# Altium footprint library 14-Inductors.PcbLib: 164 footprints (part 3 of 11)
Each footprint in its own frame and in the unit in brackets; x right, y up, seen from the top. Pads: shape width x height; smd on the part's side, far side on the other; paste and mask are expansions set on the pad; w line width, h text height; cw(c..) or ccw(c..) is an arc to the next point about the centre after c.
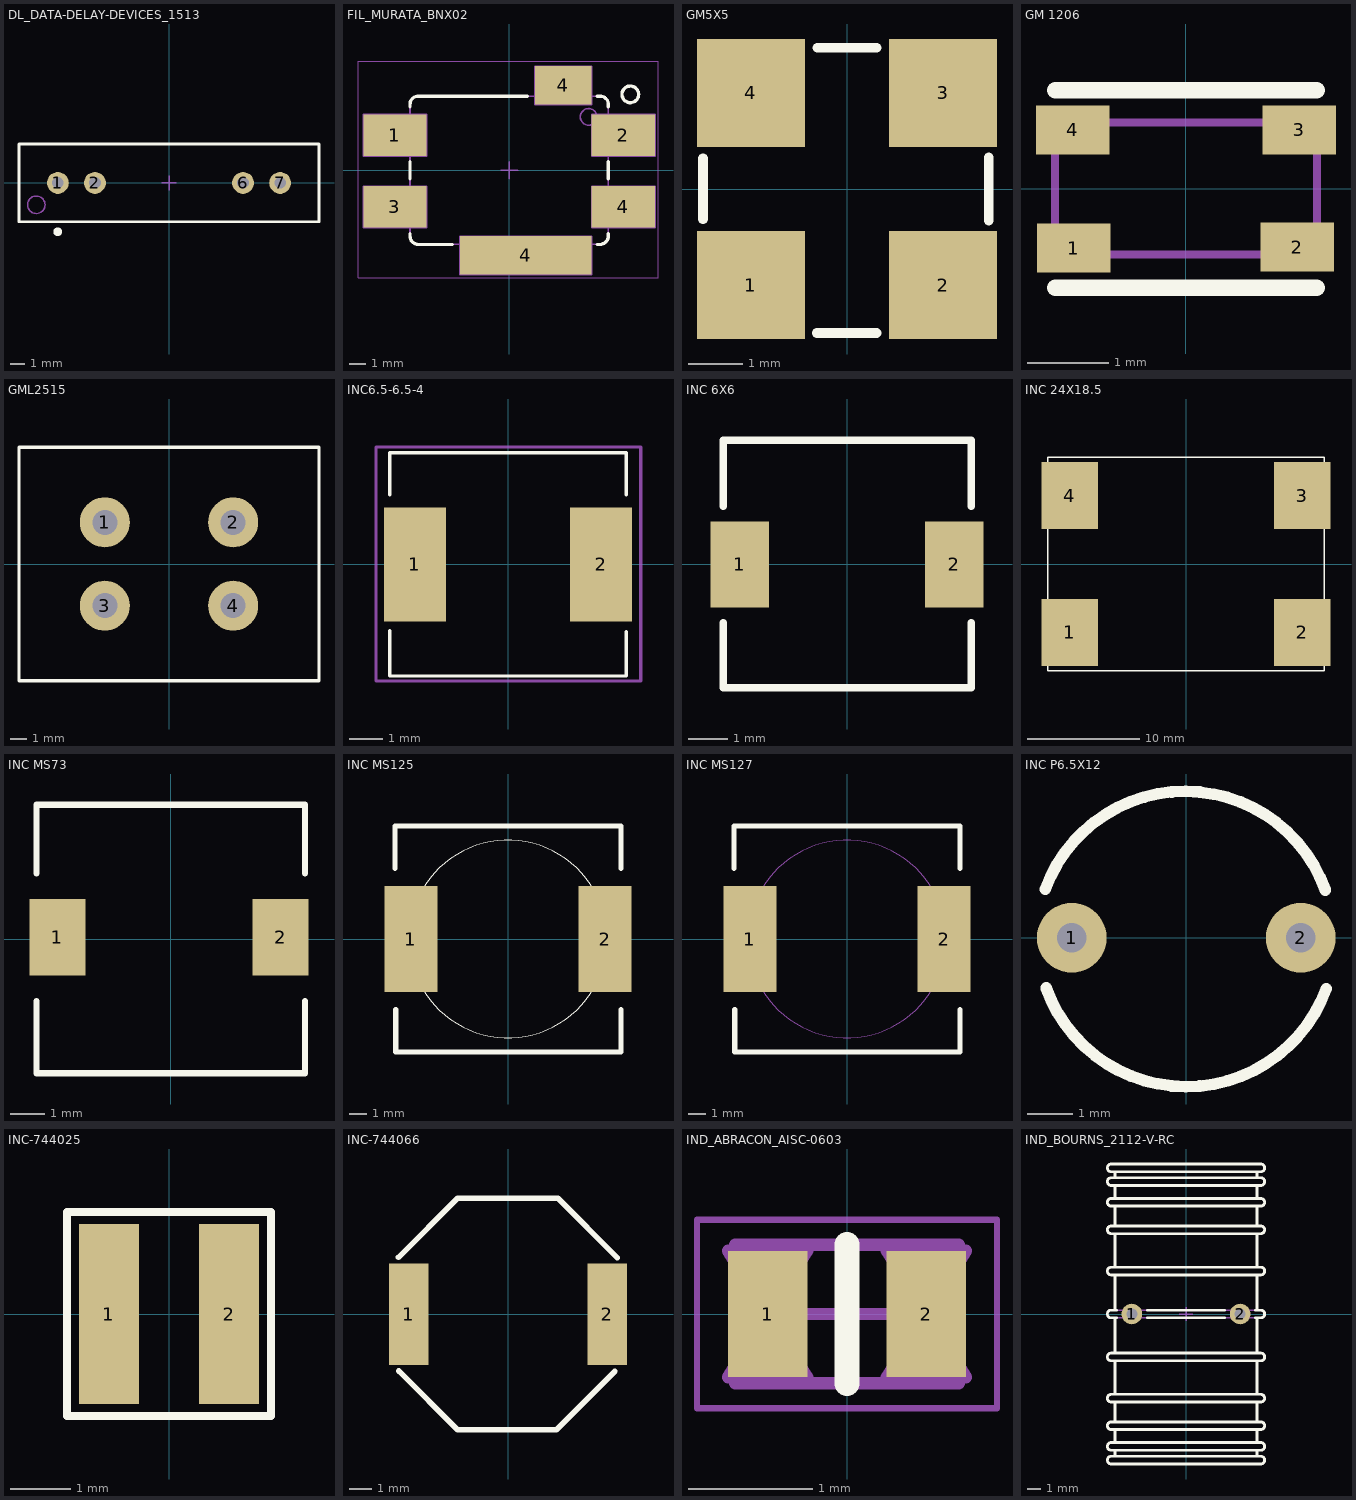
[diagram p2: the footprints below, top view; thin cyan lines are the x and y axes]

## DL_DATA-DELAY-DEVICES_1513 [mm] "Fixed SIP Delay Line Serie 1513"
height 7.11
pads (4):
  round 1.5 hole 0.8: 1(-7.62,0) 2(-5.08,0) 6(5.08,0) 7(7.62,0)
Top Overlay:
  circle w0.3: c-7.63,-3.35 r0.15
  lines w0.2: -10.287,-2.665 -10.287,2.665 10.287,2.665 10.287,-2.665 -10.287,-2.665
Mechanical 8:
  lines w0.1: -8.12,0 -7.62,0 ; -7.62,-0.5 -7.62,0 ; -7.62,0.5 -7.62,0 ; -7.12,0 -7.62,0 ; -5.58,0 -5.08,0 ; -5.08,-0.5 -5.08,0 ; -5.08,0.5 -5.08,0 ; -4.58,0 -5.08,0 ; -0.5,0 0,0 ; 0,-0.5 0,0 ; 0,0.5 0,0 ; 0.5,0 0,0 ; 4.58,0 5.08,0 ; 5.08,-0.5 5.08,0 ; 5.08,0.5 5.08,0 ; 5.58,0 5.08,0 ; 7.12,0 7.62,0 ; 7.62,-0.5 7.62,0 ; 7.62,0.5 7.62,0 ; 8.12,0 7.62,0
Mechanical 14:
  circle w0.1: c-9.1,-1.5 r0.6
  lines w0.1: -10.287,-2.665 10.287,-2.665 10.287,2.665 -10.287,2.665 -10.287,-2.665
3D body "DATA-DELAY-DEVICES_1513.stp": height 7.11, standoff -3.8, extent -10.287,-2.665 10.287,2.665

## FIL_MURATA_BNX02 [mm] "Block Type EMIFILr LC Combined Type, BNX02* Series"
height 3.3
pads (6):
  rect 3.8x2.5 smd: 1(-6.85,2.1) 2(6.85,2.1) 3(-6.85,-2.2) 4(6.85,-2.2)
  rect 7.9x2.3 smd: 4(1,-5.1)
  rect 3.4x2.3 smd: 4(3.25,5.1)
Top Overlay:
  circle w0.2: c7.268,4.554 r0.5
  lines w0.2: -5.95,-3.8 -5.95,-3.95 ccw(c-5.45,-3.95) -5.45,-4.45 -3.42,-4.45 ; -5.95,-0.5 -5.95,0.5 ; -5.95,3.8 -5.95,3.95 cw(c-5.45,3.95) -5.45,4.45 1.08,4.45 ; 5.28,-4.45 5.45,-4.45 ccw(c5.45,-3.95) 5.95,-3.95 5.95,-3.8 ; 5.28,4.45 5.45,4.45 cw(c5.45,3.95) 5.95,3.95 5.95,3.8 ; 5.95,-0.5 5.95,0.5
Mechanical 8:
  lines w0.1: -7.35,-2.2 -6.85,-2.2 ; -7.35,2.1 -6.85,2.1 ; -6.85,-2.7 -6.85,-2.2 ; -6.85,-1.7 -6.85,-2.2 ; -6.85,1.6 -6.85,2.1 ; -6.85,2.6 -6.85,2.1 ; -6.35,-2.2 -6.85,-2.2 ; -6.35,2.1 -6.85,2.1 ; -0.5,0 0,0 ; 0,-0.5 0,0 ; 0,0.5 0,0 ; 0.5,-5.1 1,-5.1 ; 0.5,0 0,0 ; 1,-5.6 1,-5.1 ; 1,-4.6 1,-5.1 ; 1.5,-5.1 1,-5.1 ; 2.75,5.1 3.25,5.1 ; 3.25,4.6 3.25,5.1 ; 3.25,5.6 3.25,5.1 ; 3.75,5.1 3.25,5.1 ; 6.35,-2.2 6.85,-2.2 ; 6.35,2.1 6.85,2.1 ; 6.85,-2.7 6.85,-2.2 ; 6.85,-1.7 6.85,-2.2 ; 6.85,1.6 6.85,2.1 ; 6.85,2.6 6.85,2.1 ; 7.35,-2.2 6.85,-2.2 ; 7.35,2.1 6.85,2.1 ; -8.75,-3.45 -4.95,-3.45 -4.95,-0.95 -8.75,-0.95 -8.75,-3.45 ; -8.75,0.85 -8.75,3.35 -4.95,3.35 -4.95,0.85 -8.75,0.85 ; -2.95,-6.25 4.95,-6.25 4.95,-3.95 -2.95,-3.95 -2.95,-6.25 ; 1.55,3.95 1.55,6.25 4.95,6.25 4.95,3.95 1.55,3.95 ; 4.95,-3.45 4.95,-0.95 8.75,-0.95 8.75,-3.45 4.95,-3.45 ; 4.95,0.85 8.75,0.85 8.75,3.35 4.95,3.35 4.95,0.85
Mechanical 14:
  circle w0.1: c4.768,3.204 r0.5
  lines w0.1: -5.95,-2.75 -6.05,-2.75 -6.05,-1.45 -5.95,-1.45 ; -5.95,1.45 -6.05,1.45 -6.05,2.75 -5.95,2.75 ; -2.5,-4.45 -2.5,-4.55 4.5,-4.55 4.5,-4.45 ; 2,4.45 2,4.55 4.5,4.55 4.5,4.45 ; 5.95,-2.75 6.05,-2.75 6.05,-1.45 5.95,-1.45 ; 5.95,1.45 6.05,1.45 6.05,2.75 5.95,2.75 ; -5.95,-3.95 ccw(c-5.45,-3.95) -5.45,-4.45 5.45,-4.45 ccw(c5.45,-3.95) 5.95,-3.95 5.95,3.95 ccw(c5.45,3.95) 5.45,4.45 -5.45,4.45 ccw(c-5.45,3.95) -5.95,3.95 -5.95,-3.95
Mechanical 15:
  lines w0.05: -9.07,-6.45 -9.07,6.55 8.93,6.55 8.93,-6.45 -9.07,-6.45
3D body "FIL_MURATA_BNX02.stp": height 3.1, standoff 0, extent -6.05,-4.55 6.05,4.55

## GM5X5 [mm]
height 25
pads (4):
  rect 2x2 smd mask+0.07: 1(-1.778,-1.778) 2(1.778,-1.778) 3(1.778,1.778)
  rect 2x2 smd: 4(-1.778,1.778)
Top Overlay:
  lines w0.178: -2.667,-0.559 -2.667,0.572 ; -0.559,-2.667 0.546,-2.667 ; -0.546,2.616 0.546,2.616 ; 2.629,-0.584 2.629,0.584
3D body "2-2-dionc.stp": height 0.02, standoff 0, extent 0.778,0.778 2.778,2.778
3D body "2-2-dionc.stp": height 0.02, standoff 0, extent 0.778,-2.778 2.778,-0.778
3D body "2-2-dionc.stp": height 0.02, standoff 0, extent -2.778,-2.778 -0.778,-0.778
3D body "2-2-dionc.stp": height 0.02, standoff 0, extent -2.778,0.778 -0.778,2.778
3D body "gm-5x5.stp": height 4.5, standoff 0, extent -2.5,-2.54 2.5,2.46

## GM 1206 [mm]
height 25
pads (4):
  rect 0.9x0.6 smd mask+0.07: 1(-1.372,-0.724) 2(1.359,-0.711) 4(-1.384,0.724)
  rect 0.9x0.6 smd: 3(1.384,0.724)
Top Overlay:
  lines w0.2: -1.6,-1.206 1.6,-1.206 ; -1.6,1.206 1.6,1.206
Mechanical 15:
  lines w0.1: -1.6,-0.8 1.6,-0.8 1.6,0.813 -1.6,0.813 -1.6,-0.8
3D body "gminc-1206.stp": height 2, standoff 0, extent -1.6,-0.8 1.6,0.8
3D body "0_9-0_6.stp": height 0, standoff 0, extent -1.834,0.424 -0.934,1.024
3D body "0_9-0_6.stp": height 0, standoff 0, extent -1.822,-1.024 -0.922,-0.424
3D body "0_9-0_6.stp": height 0, standoff 0, extent 0.909,-1.011 1.809,-0.411
3D body "0_9-0_6.stp": height 0, standoff 0, extent 0.934,0.424 1.834,1.024

## GML2515 [mm]
height 25
pads (4):
  round 3 hole 1.5 mask+0.07: 1(-3.85,2.5) 2(3.85,2.5) 4(3.85,-2.5)
  round 3 hole 1.5: 3(-3.85,-2.5)
Top Overlay:
  lines w0.2: -9,-7 -9,7 9,7 9,-7 -9,-7
3D body "T251512.step": height 30.11, standoff -3, extent -16,-10.513 16,10.487

## INC6.5-6.5-4 [mm]
height 25
pads (2):
  rect 1.85x3.4 smd: 1(-2.775,0) 2(2.775,0)
Top Overlay:
  lines w0.1: -3.531,-1.981 -3.531,-3.327 3.531,-3.327 3.531,-2.007 ; -3.531,2.083 -3.531,3.327 3.531,3.327 3.531,2.083
Mechanical 15:
  lines w0.1: -3.937,-3.48 -3.937,3.505 3.962,3.505 3.962,-3.48 -3.937,-3.48
3D body "1_85-3_4.stp": height 0.01, standoff 0, extent -3.7,-1.7 -1.85,1.7
3D body "1_85-3_4.stp": height 0.01, standoff 0, extent 1.85,-1.7 3.7,1.7
3D body "inc6_5-6_5.stp": height 4.01, standoff 0, extent -3.45,-3.25 3.45,3.25

## INC 6X6 [mm] "TDK"
height 25
pads (2):
  rect 1.5x2.2 smd: 1(-2.75,0)
  rect 1.5x2.2 smd mask+0.07: 2(2.75,0)
Top Overlay:
  lines w0.2: -3.175,-1.5 -3.175,-3.162 3.188,-3.162 3.188,-1.5 ; -3.175,1.5 -3.175,3.188 3.188,3.188 3.188,1.5
3D body "inc-6x6tdk.stp": height 2.52, standoff -0.02, extent -3,-3 3,3
3D body "1_5-2_2.stp": height 0.02, standoff 0, extent -3.518,-1.1 -2.018,1.1
3D body "1_5-2_2.stp": height 0.02, standoff 0, extent 2.005,-1.092 3.505,1.108

## INC 24X18.5 [mm]
height 25
pads (4):
  rect 5x6 smd mask+0.07: 1(-10.355,-6.096) 2(10.355,-6.096) 4(-10.355,6.096)
  rect 5x6 smd: 3(10.355,6.096)
Top Overlay:
  lines w0.127: -12.3,-9.5 12.3,-9.5 12.3,9.5 -12.3,9.5 -12.3,-9.5
3D body "inc24-16.stp": height 10, standoff 0, extent -11.65,-9.25 11.65,9.25

## INC MS73 [mm]
height 25
pads (2):
  rect 1.6x2.2 smd mask+0.07: 1(-3.25,0.05)
  rect 1.6x2.2 smd: 2(3.15,0.05)
Top Overlay:
  lines w0.178: -3.85,-1.775 -3.85,-3.85 3.85,-3.85 3.85,-1.775 ; -3.85,1.875 -3.85,3.85 3.85,3.85 3.85,1.875
3D body "ms73.stp": height 3.3, standoff -0.2, extent -3.65,-3.65 3.65,3.65
3D body "2_2-1_6-ms73.stp": height 0.02, standoff 0, extent -4.077,-1.062 -2.476,1.138
3D body "2_2-1_6-ms73.stp": height 0.02, standoff 0, extent 2.35,-1.049 3.95,1.151

## INC MS125 [mm]
height 25
pads (2):
  rect 3x6 smd mask+0.07: 1(-5.5,0)
  rect 3x6 smd: 2(5.5,0)
Top Overlay:
  circle w0.051: c0,0 r5.601
  lines w0.3: -6.4,4 -6.4,6.4 6.4,6.4 6.4,4 ; -6.36,-4 -6.36,-6.4 6.4,-6.4 6.4,-4
3D body "6-3ms127.stp": height 0.02, standoff 0, extent 4.012,-3.025 7.012,2.975
3D body "6-3ms127.stp": height 0.02, standoff 0, extent -7.024,-2.962 -4.024,3.038
3D body "ms125.stp": height 5.95, standoff -0.3, extent -6,-6.1 6,5.9
3D body "6-3-ms125.stp": height 0.02, standoff 0, extent -7,-3 -4,3
3D body "6-3-ms125.stp": height 0.02, standoff 0, extent 4,-3 7,3

## INC MS127 [mm]
height 25
pads (2):
  rect 3x6 smd mask+0.07: 1(-5.5,0.013)
  rect 3x6 smd: 2(5.5,0.013)
Top Overlay:
  lines w0.3: -6.4,4.013 -6.4,6.413 6.4,6.413 6.4,4.013 ; -6.36,-3.987 -6.36,-6.387 6.4,-6.387 6.4,-3.987
Mechanical 15:
  circle w0.051: c0,0.013 r5.601
3D body "ms128.stp": height 8, standoff -0.3, extent -6,-5.987 6,6.013
3D body "6-3ms127.stp": height 0.02, standoff 0, extent -7.037,-2.974 -4.037,3.025
3D body "6-3ms127.stp": height 0.02, standoff 0, extent 3.999,-3 6.999,3

## INC P6.5X12 [mm]
height 25
pads (2):
  round 1.524 hole 0.65: 1(-2.5,0) 2(2.5,0)
Top Overlay:
  lines w0.254: -3.079,1.062 cw(c-0.025,-0.051) 3.037,1.039 ; -3.062,-1.089 ccw(c0,0) 3.054,-1.113
3D body "l66p.stp": height 10.87, standoff -2, extent -4,-4 4,4

## INC-744025 [mm]
height 25
pads (2):
  rect 1x3 smd mask+0.07: 1(-1,0)
  rect 1x3 smd: 2(1,0)
Top Overlay:
  lines w0.127: -1.7,-1.7 -1.7,1.7 1.7,1.7 1.7,-1.7 -1.7,-1.7
3D body "3_2-1.stp": height 0.02, standoff 0, extent 0.605,-1.6 1.605,1.6
3D body "3_2-1.stp": height 0.02, standoff 0, extent -1.605,-1.6 -0.605,1.6
3D body "wurth-744025.stp": height 2.8, standoff 0, extent -1.362,-1.425 1.438,1.375

## INC-744066 [mm]
height 25
pads (2):
  rect 1.8x4.6 smd mask+0.07: 1(-4.5,0)
  rect 1.8x4.6 smd: 2(4.5,0)
Top Overlay:
  lines w0.254: -4.966,2.578 -2.286,5.258 2.261,5.258 4.959,2.559 ; -4.947,-2.572 -2.286,-5.232 2.197,-5.232 4.845,-2.584
3D body "4_6-1_8.stp": height 0.02, standoff 0, extent 3.608,-2.313 5.408,2.287
3D body "4_6-1_8.stp": height 0.02, standoff 0, extent -5.434,-2.3 -3.634,2.3
3D body "inc-744066.stp": height 3.8, standoff 0, extent -5.042,-5.004 4.958,4.996

## IND_ABRACON_AISC-0603 [mm] "Inductor, Molded Body; 1.8mm L X 1.12mm W, AISC-0603 Serie"
height 1.02
pads (2):
  rect 0.64x1.02 smd: 1(-0.64,0) 2(0.64,0)
Top Overlay:
  lines w0.2: 0,-0.56 0,0.56
Mechanical 8:
  lines w0.1: -0.96,-0.51 -0.64,0 ; -0.96,0.51 -0.64,0 ; -0.5,0 0,0 ; -0.32,-0.51 -0.64,0 ; -0.32,0.51 -0.64,0 ; 0,-0.5 0,0 ; 0,0.5 0,0 ; 0.32,-0.51 0.64,0 ; 0.32,0.51 0.64,0 ; 0.5,0 0,0 ; 0.96,-0.51 0.64,0 ; 0.96,0.51 0.64,0
Mechanical 14:
  lines w0.1: -0.9,-0.56 -0.9,0.56 0.9,0.56 0.9,-0.56 -0.9,-0.56
Mechanical 15:
  lines w0.05: -1.21,-0.76 1.21,-0.76 1.21,0.76 -1.21,0.76 -1.21,-0.76
3D body "IND_ABRACON_AISC-0603.stp": height 1, standoff 0, extent -0.9,-0.56 0.9,0.56

## IND_BOURNS_2112-V-RC [mm] "Vertical Leaded Toroidal Inductor Lead Spacing 7.87mm D21.84mm x W11.43mm"
height 21.84
pads (2):
  round 1.5 hole 0.8: 1(-3.937,0) 2(3.937,0)
Top Overlay:
  lines w0.2: -5.155,-10.34 -5.155,-9.9 ; -5.155,-9.34 -5.155,-8.4 ; -5.155,-7.84 -5.155,-6.4 ; -5.155,-5.84 -5.155,-3.4 ; -5.155,-2.84 -5.155,-0.28 ; -5.155,0.28 -5.155,2.84 ; -5.155,3.4 -5.155,5.84 ; -5.155,6.4 -5.155,7.84 ; -5.155,8.4 -5.155,9.34 ; -5.155,9.9 -5.155,10.34 ; -5.052,-0.28 -5.435,-0.28 cw(c-5.435,0) -5.435,0.28 -5.052,0.28 ; -2.822,-0.28 2.822,-0.28 ; -2.822,0.28 2.822,0.28 ; 5.052,-0.28 5.435,-0.28 ccw(c5.435,0) 5.435,0.28 ; 5.155,-10.34 5.155,-9.9 ; 5.155,-9.34 5.155,-8.4 ; 5.155,-7.84 5.155,-6.4 ; 5.155,-5.84 5.155,-3.4 ; 5.155,-2.84 5.155,-0.28 ; 5.155,0.28 5.155,2.84 ; 5.155,3.4 5.155,5.84 ; 5.155,6.4 5.155,7.84 ; 5.155,8.4 5.155,9.34 ; 5.155,9.9 5.155,10.34 ; 5.435,0.28 5.052,0.28 5.435,0.28 ; -5.435,-10.9 cw(c-5.435,-10.62) -5.435,-10.34 5.435,-10.34 cw(c5.435,-10.62) 5.435,-10.9 -5.435,-10.9 ; -5.435,-9.9 cw(c-5.435,-9.62) -5.435,-9.34 5.435,-9.34 cw(c5.435,-9.62) 5.435,-9.9 -5.435,-9.9 ; -5.435,-8.4 cw(c-5.435,-8.12) -5.435,-7.84 5.435,-7.84 cw(c5.435,-8.12) 5.435,-8.4 -5.435,-8.4 ; -5.435,-6.4 cw(c-5.435,-6.12) -5.435,-5.84 5.435,-5.84 cw(c5.435,-6.12) 5.435,-6.4 -5.435,-6.4 ; -5.435,-3.4 cw(c-5.435,-3.12) -5.435,-2.84 5.435,-2.84 cw(c5.435,-3.12) 5.435,-3.4 -5.435,-3.4 ; -5.435,2.84 cw(c-5.435,3.12) -5.435,3.4 5.435,3.4 cw(c5.435,3.12) 5.435,2.84 -5.435,2.84 ; -5.435,5.84 cw(c-5.435,6.12) -5.435,6.4 5.435,6.4 cw(c5.435,6.12) 5.435,5.84 -5.435,5.84 ; -5.435,7.84 cw(c-5.435,8.12) -5.435,8.4 5.435,8.4 cw(c5.435,8.12) 5.435,7.84 -5.435,7.84 ; -5.435,9.34 cw(c-5.435,9.62) -5.435,9.9 5.435,9.9 cw(c5.435,9.62) 5.435,9.34 -5.435,9.34 ; -5.435,10.34 cw(c-5.435,10.62) -5.435,10.9 5.435,10.9 cw(c5.435,10.62) 5.435,10.34 -5.435,10.34
Mechanical 8:
  lines w0.1: -4.437,0 -3.937,0 ; -3.937,-0.5 -3.937,0 ; -3.937,0.5 -3.937,0 ; -3.437,0 -3.937,0 ; -0.5,0 0,0 ; 0,-0.5 0,0 ; 0,0.5 0,0 ; 0.5,0 0,0 ; 3.437,0 3.937,0 ; 3.937,-0.5 3.937,0 ; 3.937,0.5 3.937,0 ; 4.437,0 3.937,0
Mechanical 14:
  lines w0.1: -5.155,-10.34 -5.155,-9.9 ; -5.155,-9.34 -5.155,-8.4 ; -5.155,-7.84 -5.155,-6.4 ; -5.155,-5.84 -5.155,-3.4 ; -5.155,-2.84 -5.155,-0.28 ; -5.155,0.28 -5.155,2.84 ; -5.155,3.4 -5.155,5.84 ; -5.155,6.4 -5.155,7.84 ; -5.155,8.4 -5.155,9.34 ; -5.155,9.9 -5.155,10.34 ; 5.155,-10.34 5.155,-9.9 ; 5.155,-9.34 5.155,-8.4 ; 5.155,-7.84 5.155,-6.4 ; 5.155,-5.84 5.155,-3.4 ; 5.155,-2.84 5.155,-0.28 ; 5.155,0.28 5.155,2.84 ; 5.155,3.4 5.155,5.84 ; 5.155,6.4 5.155,7.84 ; 5.155,8.4 5.155,9.34 ; 5.155,9.9 5.155,10.34 ; -5.435,-10.9 cw(c-5.435,-10.62) -5.435,-10.34 5.435,-10.34 cw(c5.435,-10.62) 5.435,-10.9 -5.435,-10.9 ; -5.435,-9.9 cw(c-5.435,-9.62) -5.435,-9.34 5.435,-9.34 cw(c5.435,-9.62) 5.435,-9.9 -5.435,-9.9 ; -5.435,-8.4 cw(c-5.435,-8.12) -5.435,-7.84 5.435,-7.84 cw(c5.435,-8.12) 5.435,-8.4 -5.435,-8.4 ; -5.435,-6.4 cw(c-5.435,-6.12) -5.435,-5.84 5.435,-5.84 cw(c5.435,-6.12) 5.435,-6.4 -5.435,-6.4 ; -5.435,-3.4 cw(c-5.435,-3.12) -5.435,-2.84 5.435,-2.84 cw(c5.435,-3.12) 5.435,-3.4 -5.435,-3.4 ; -5.435,-0.28 cw(c-5.435,0) -5.435,0.28 5.435,0.28 cw(c5.435,0) 5.435,-0.28 -5.435,-0.28 ; -5.435,2.84 cw(c-5.435,3.12) -5.435,3.4 5.435,3.4 cw(c5.435,3.12) 5.435,2.84 -5.435,2.84 ; -5.435,5.84 cw(c-5.435,6.12) -5.435,6.4 5.435,6.4 cw(c5.435,6.12) 5.435,5.84 -5.435,5.84 ; -5.435,7.84 cw(c-5.435,8.12) -5.435,8.4 5.435,8.4 cw(c5.435,8.12) 5.435,7.84 -5.435,7.84 ; -5.435,9.34 cw(c-5.435,9.62) -5.435,9.9 5.435,9.9 cw(c5.435,9.62) 5.435,9.34 -5.435,9.34 ; -5.435,10.34 cw(c-5.435,10.62) -5.435,10.9 5.435,10.9 cw(c5.435,10.62) 5.435,10.34 -5.435,10.34
3D body "IND_BOURNS_2112-V-RC.stp": height 21.8, standoff -3.32, extent -5.715,-10.9 5.715,10.9